# Altium schematic symbol library jlcpcb_2025_04_resistors_extended_0201.schlib: 1508 symbols (part 4 of 8) (continued)
## RC0201FR-0724K3L
designator R?  Resistance: 24.3kΩ  (hidden comment: *)
Resistor, 24.3kΩ, ±1%, 50mW, 25V, ±200ppm/℃, -55℃~+125℃, SMD 0201; Manufacturer: Uniroyal; Manufacturer Part Number: RC0201FR-0724K3L; Supplier 1: LCSC; Supplier Part Number 1: C474619; JLCPCB Part Number: C474619; Power Rating: 50mW; Category: Resistors; Package Size: 0201; JLCPCB Basic Part: Yes; Tolerance: ±1%; Voltage Rating: 25V; Temperature Coefficient: ±200ppm/℃; Temperature Rating: -55℃~+125℃; ComponentLink1Description: Datasheet; ComponentLink1URL: https://wmsc.lcsc.com/wmsc/upload/file/pdf/v2/lcsc/2311211101_YAGEO-RC0201FR-0724K3L_C474619.pdf; ComponentLink2Description: JLCPCB Part URL; ComponentLink2URL: https://jlcpcb.com/partdetail/C474619
pins: 1, 2
1 alternate drawing of the same symbol

## RC0201FR-0724K9L
designator R?  Resistance: 24.9kΩ  (hidden comment: *)
Resistor, 24.9kΩ, ±1%, 50mW, ±200ppm/℃, -55℃~+125℃, SMD 0201; Manufacturer: Uniroyal; Manufacturer Part Number: RC0201FR-0724K9L; Supplier 1: LCSC; Supplier Part Number 1: C474621; JLCPCB Part Number: C474621; Power Rating: 50mW; Category: Resistors; Package Size: 0201; JLCPCB Basic Part: Yes; Tolerance: ±1%; Temperature Coefficient: ±200ppm/℃; Temperature Rating: -55℃~+125℃; ComponentLink1Description: Datasheet; ComponentLink1URL: https://wmsc.lcsc.com/wmsc/upload/file/pdf/v2/lcsc/2311211101_YAGEO-RC0201FR-0724K9L_C474621.pdf; ComponentLink2Description: JLCPCB Part URL; ComponentLink2URL: https://jlcpcb.com/partdetail/C474621
pins: 1, 2
1 alternate drawing of the same symbol

## RC0201FR-0724KL
designator R?  Resistance: 24kΩ  (hidden comment: *)
Resistor, 24kΩ, ±1%, 50mW, 25V, ±200ppm/℃, -55℃~+125℃, SMD 0201; Manufacturer: Uniroyal; Manufacturer Part Number: RC0201FR-0724KL; Supplier 1: LCSC; Supplier Part Number 1: C273277; JLCPCB Part Number: C273277; Power Rating: 50mW; Category: Resistors; Package Size: 0201; JLCPCB Basic Part: Yes; Tolerance: ±1%; Voltage Rating: 25V; Temperature Coefficient: ±200ppm/℃; Temperature Rating: -55℃~+125℃; ComponentLink1Description: Datasheet; ComponentLink1URL: https://wmsc.lcsc.com/wmsc/upload/file/pdf/v2/lcsc/2304140030_YAGEO-RC0201FR-0724KL_C273277.pdf; ComponentLink2Description: JLCPCB Part URL; ComponentLink2URL: https://jlcpcb.com/partdetail/C273277
pins: 1, 2
1 alternate drawing of the same symbol

## RC0201FR-0724R9L
designator R?  Resistance: 24.9Ω  (hidden comment: *)
Resistor, 24.9Ω, ±1%, 50mW, 15V, ±200ppm/℃, -55℃~+125℃, SMD 0201; Manufacturer: Uniroyal; Manufacturer Part Number: RC0201FR-0724R9L; Supplier 1: LCSC; Supplier Part Number 1: C273274; JLCPCB Part Number: C273274; Power Rating: 50mW; Category: Resistors; Package Size: 0201; JLCPCB Basic Part: Yes; Tolerance: ±1%; Voltage Rating: 15V; Temperature Coefficient: ±200ppm/℃; Temperature Rating: -55℃~+125℃; ComponentLink1Description: Datasheet; ComponentLink1URL: https://wmsc.lcsc.com/wmsc/upload/file/pdf/v2/lcsc/2112151830_YAGEO-RC0201FR-0724R9L_C273274.pdf; ComponentLink2Description: JLCPCB Part URL; ComponentLink2URL: https://jlcpcb.com/partdetail/C273274
pins: 1, 2
1 alternate drawing of the same symbol

## RC0201FR-0726K7L
designator R?  Resistance: 26.7kΩ  (hidden comment: *)
Resistor, 26.7kΩ, ±1%, 50mW, ±200ppm/℃, -55℃~+125℃, SMD 0201; Manufacturer: Uniroyal; Manufacturer Part Number: RC0201FR-0726K7L; Supplier 1: LCSC; Supplier Part Number 1: C474627; JLCPCB Part Number: C474627; Power Rating: 50mW; Category: Resistors; Package Size: 0201; JLCPCB Basic Part: Yes; Tolerance: ±1%; Temperature Coefficient: ±200ppm/℃; Temperature Rating: -55℃~+125℃; ComponentLink1Description: Datasheet; ComponentLink1URL: https://wmsc.lcsc.com/wmsc/upload/file/pdf/v2/lcsc/2311211101_YAGEO-RC0201FR-0726K7L_C474627.pdf; ComponentLink2Description: JLCPCB Part URL; ComponentLink2URL: https://jlcpcb.com/partdetail/C474627
pins: 1, 2
1 alternate drawing of the same symbol

## RC0201FR-0727K4L
designator R?  Resistance: 27.4kΩ  (hidden comment: *)
Resistor, 27.4kΩ, ±1%, 50mW, 25V, ±200ppm/℃, -55℃~+125℃, SMD 0201; Manufacturer: Uniroyal; Manufacturer Part Number: RC0201FR-0727K4L; Supplier 1: LCSC; Supplier Part Number 1: C273316; JLCPCB Part Number: C273316; Power Rating: 50mW; Category: Resistors; Package Size: 0201; JLCPCB Basic Part: Yes; Tolerance: ±1%; Voltage Rating: 25V; Temperature Coefficient: ±200ppm/℃; Temperature Rating: -55℃~+125℃; ComponentLink1Description: Datasheet; ComponentLink1URL: https://wmsc.lcsc.com/wmsc/upload/file/pdf/v2/lcsc/2304140030_YAGEO-RC0201FR-0727K4L_C273316.pdf; ComponentLink2Description: JLCPCB Part URL; ComponentLink2URL: https://jlcpcb.com/partdetail/C273316
pins: 1, 2
1 alternate drawing of the same symbol

## RC0201FR-0727KL
designator R?  Resistance: 27kΩ  (hidden comment: *)
Resistor, 27kΩ, ±1%, 50mW, 25V, ±200ppm/℃, -55℃~+125℃, SMD 0201; Manufacturer: Uniroyal; Manufacturer Part Number: RC0201FR-0727KL; Supplier 1: LCSC; Supplier Part Number 1: C273283; JLCPCB Part Number: C273283; Power Rating: 50mW; Category: Resistors; Package Size: 0201; JLCPCB Basic Part: Yes; Tolerance: ±1%; Voltage Rating: 25V; Temperature Coefficient: ±200ppm/℃; Temperature Rating: -55℃~+125℃; ComponentLink1Description: Datasheet; ComponentLink1URL: https://wmsc.lcsc.com/wmsc/upload/file/pdf/v2/lcsc/2304140030_YAGEO-RC0201FR-0727KL_C273283.pdf; ComponentLink2Description: JLCPCB Part URL; ComponentLink2URL: https://jlcpcb.com/partdetail/C273283
pins: 1, 2
1 alternate drawing of the same symbol

## RC0201FR-0727RL
designator R?  Resistance: 27Ω  (hidden comment: *)
Resistor, 27Ω, ±1%, 50mW, 25V, ±200ppm/℃, -55℃~+125℃, SMD 0201; Manufacturer: Uniroyal; Manufacturer Part Number: RC0201FR-0727RL; Supplier 1: LCSC; Supplier Part Number 1: C273268; JLCPCB Part Number: C273268; Power Rating: 50mW; Category: Resistors; Package Size: 0201; JLCPCB Basic Part: Yes; Tolerance: ±1%; Voltage Rating: 25V; Temperature Coefficient: ±200ppm/℃; Temperature Rating: -55℃~+125℃; ComponentLink1Description: Datasheet; ComponentLink1URL: https://wmsc.lcsc.com/wmsc/upload/file/pdf/v2/lcsc/2304140030_YAGEO-RC0201FR-0727RL_C273268.pdf; ComponentLink2Description: JLCPCB Part URL; ComponentLink2URL: https://jlcpcb.com/partdetail/C273268
pins: 1, 2
1 alternate drawing of the same symbol

## RC0201FR-0728KL
designator R?  Resistance: 28kΩ  (hidden comment: *)
Resistor, 28kΩ, ±1%, 50mW, 25V, ±200ppm/℃, -55℃~+125℃, SMD 0201; Manufacturer: Uniroyal; Manufacturer Part Number: RC0201FR-0728KL; Supplier 1: LCSC; Supplier Part Number 1: C273300; JLCPCB Part Number: C273300; Power Rating: 50mW; Category: Resistors; Package Size: 0201; JLCPCB Basic Part: Yes; Tolerance: ±1%; Voltage Rating: 25V; Temperature Coefficient: ±200ppm/℃; Temperature Rating: -55℃~+125℃; ComponentLink1Description: Datasheet; ComponentLink1URL: https://wmsc.lcsc.com/wmsc/upload/file/pdf/v2/lcsc/2201242230_YAGEO-RC0201FR-0728KL_C273300.pdf; ComponentLink2Description: JLCPCB Part URL; ComponentLink2URL: https://jlcpcb.com/partdetail/C273300
pins: 1, 2
1 alternate drawing of the same symbol

## RC0201FR-0729K4L
designator R?  Resistance: 29.4kΩ  (hidden comment: *)
Resistor, 29.4kΩ, ±1%, 50mW, 25V, ±200ppm/℃, -55℃~+125℃, SMD 0201; Manufacturer: Uniroyal; Manufacturer Part Number: RC0201FR-0729K4L; Supplier 1: LCSC; Supplier Part Number 1: C138157; JLCPCB Part Number: C138157; Power Rating: 50mW; Category: Resistors; Package Size: 0201; JLCPCB Basic Part: Yes; Tolerance: ±1%; Voltage Rating: 25V; Temperature Coefficient: ±200ppm/℃; Temperature Rating: -55℃~+125℃; ComponentLink1Description: Datasheet; ComponentLink1URL: https://wmsc.lcsc.com/wmsc/upload/file/pdf/v2/lcsc/2304140030_YAGEO-RC0201FR-0729K4L_C138157.pdf; ComponentLink2Description: JLCPCB Part URL; ComponentLink2URL: https://jlcpcb.com/partdetail/C138157
pins: 1, 2
1 alternate drawing of the same symbol

## RC0201FR-0730K1L
designator R?  Resistance: 30.1kΩ  (hidden comment: *)
Resistor, 30.1kΩ, ±1%, 50mW, 25V, ±200ppm/℃, -55℃~+125℃, SMD 0201; Manufacturer: Uniroyal; Manufacturer Part Number: RC0201FR-0730K1L; Supplier 1: LCSC; Supplier Part Number 1: C273278; JLCPCB Part Number: C273278; Power Rating: 50mW; Category: Resistors; Package Size: 0201; JLCPCB Basic Part: Yes; Tolerance: ±1%; Voltage Rating: 25V; Temperature Coefficient: ±200ppm/℃; Temperature Rating: -55℃~+125℃; ComponentLink1Description: Datasheet; ComponentLink1URL: https://wmsc.lcsc.com/wmsc/upload/file/pdf/v2/lcsc/2304140030_YAGEO-RC0201FR-0730K1L_C273278.pdf; ComponentLink2Description: JLCPCB Part URL; ComponentLink2URL: https://jlcpcb.com/partdetail/C273278
pins: 1, 2
1 alternate drawing of the same symbol

## RC0201FR-0730R1L
designator R?  Resistance: 30.1Ω  (hidden comment: *)
Resistor, 30.1Ω, ±1%, 50mW, 25V, ±200ppm/℃, -55℃~+125℃, SMD 0201; Manufacturer: Uniroyal; Manufacturer Part Number: RC0201FR-0730R1L; Supplier 1: LCSC; Supplier Part Number 1: C474673; JLCPCB Part Number: C474673; Power Rating: 50mW; Category: Resistors; Package Size: 0201; JLCPCB Basic Part: Yes; Tolerance: ±1%; Voltage Rating: 25V; Temperature Coefficient: ±200ppm/℃; Temperature Rating: -55℃~+125℃; ComponentLink1Description: Datasheet; ComponentLink1URL: https://wmsc.lcsc.com/wmsc/upload/file/pdf/v2/lcsc/2311211101_YAGEO-RC0201FR-0730R1L_C474673.pdf; ComponentLink2Description: JLCPCB Part URL; ComponentLink2URL: https://jlcpcb.com/partdetail/C474673
pins: 1, 2
1 alternate drawing of the same symbol

## RC0201FR-0732K4L
designator R?  Resistance: 32.4kΩ  (hidden comment: *)
Resistor, 32.4kΩ, ±1%, 50mW, 25V, ±200ppm/℃, -55℃~+125℃, SMD 0201; Manufacturer: Uniroyal; Manufacturer Part Number: RC0201FR-0732K4L; Supplier 1: LCSC; Supplier Part Number 1: C138150; JLCPCB Part Number: C138150; Power Rating: 50mW; Category: Resistors; Package Size: 0201; JLCPCB Basic Part: Yes; Tolerance: ±1%; Voltage Rating: 25V; Temperature Coefficient: ±200ppm/℃; Temperature Rating: -55℃~+125℃; ComponentLink1Description: Datasheet; ComponentLink1URL: https://wmsc.lcsc.com/wmsc/upload/file/pdf/v2/lcsc/2304140030_YAGEO-RC0201FR-0732K4L_C138150.pdf; ComponentLink2Description: JLCPCB Part URL; ComponentLink2URL: https://jlcpcb.com/partdetail/C138150
pins: 1, 2
1 alternate drawing of the same symbol

## RC0201FR-0733K2L
designator R?  Resistance: 33.2kΩ  (hidden comment: *)
Resistor, 33.2kΩ, ±1%, 50mW, 25V, ±200ppm/℃, -55℃~+125℃, SMD 0201; Manufacturer: Uniroyal; Manufacturer Part Number: RC0201FR-0733K2L; Supplier 1: LCSC; Supplier Part Number 1: C474684; JLCPCB Part Number: C474684; Power Rating: 50mW; Category: Resistors; Package Size: 0201; JLCPCB Basic Part: Yes; Tolerance: ±1%; Voltage Rating: 25V; Temperature Coefficient: ±200ppm/℃; Temperature Rating: -55℃~+125℃; ComponentLink1Description: Datasheet; ComponentLink1URL: https://wmsc.lcsc.com/wmsc/upload/file/pdf/v2/lcsc/2311211101_YAGEO-RC0201FR-0733K2L_C474684.pdf; ComponentLink2Description: JLCPCB Part URL; ComponentLink2URL: https://jlcpcb.com/partdetail/C474684
pins: 1, 2
1 alternate drawing of the same symbol

## RC0201FR-0733KL
designator R?  Resistance: 33kΩ  (hidden comment: *)
Resistor, 33kΩ, ±1%, 50mW, 25V, ±200ppm/℃, -55℃~+125℃, SMD 0201; Manufacturer: Uniroyal; Manufacturer Part Number: RC0201FR-0733KL; Supplier 1: LCSC; Supplier Part Number 1: C155694; JLCPCB Part Number: C155694; Power Rating: 50mW; Category: Resistors; Package Size: 0201; JLCPCB Basic Part: Yes; Tolerance: ±1%; Voltage Rating: 25V; Temperature Coefficient: ±200ppm/℃; Temperature Rating: -55℃~+125℃; ComponentLink1Description: Datasheet; ComponentLink1URL: https://wmsc.lcsc.com/wmsc/upload/file/pdf/v2/lcsc/2304140030_YAGEO-RC0201FR-0733KL_C155694.pdf; ComponentLink2Description: JLCPCB Part URL; ComponentLink2URL: https://jlcpcb.com/partdetail/C155694
pins: 1, 2
1 alternate drawing of the same symbol

## RC0201FR-0733R2L
designator R?  Resistance: 33.2Ω  (hidden comment: *)
Resistor, 33.2Ω, ±1%, 50mW, ±200ppm/℃, -55℃~+125℃, SMD 0201; Manufacturer: Uniroyal; Manufacturer Part Number: RC0201FR-0733R2L; Supplier 1: LCSC; Supplier Part Number 1: C474685; JLCPCB Part Number: C474685; Power Rating: 50mW; Category: Resistors; Package Size: 0201; JLCPCB Basic Part: Yes; Tolerance: ±1%; Temperature Coefficient: ±200ppm/℃; Temperature Rating: -55℃~+125℃; ComponentLink1Description: Datasheet; ComponentLink1URL: https://wmsc.lcsc.com/wmsc/upload/file/pdf/v2/lcsc/2311211101_YAGEO-RC0201FR-0733R2L_C474685.pdf; ComponentLink2Description: JLCPCB Part URL; ComponentLink2URL: https://jlcpcb.com/partdetail/C474685
pins: 1, 2
1 alternate drawing of the same symbol

## RC0201FR-0733RL
designator R?  Resistance: 33Ω  (hidden comment: *)
Resistor, 33Ω, ±1%, 50mW, 25V, ±200ppm/℃, -55℃~+125℃, SMD 0201; Manufacturer: Uniroyal; Manufacturer Part Number: RC0201FR-0733RL; Supplier 1: LCSC; Supplier Part Number 1: C295794; JLCPCB Part Number: C295794; Power Rating: 50mW; Category: Resistors; Package Size: 0201; JLCPCB Basic Part: Yes; Tolerance: ±1%; Voltage Rating: 25V; Temperature Coefficient: ±200ppm/℃; Temperature Rating: -55℃~+125℃; ComponentLink1Description: Datasheet; ComponentLink1URL: https://wmsc.lcsc.com/wmsc/upload/file/pdf/v2/lcsc/2304140030_YAGEO-RC0201FR-0733RL_C295794.pdf; ComponentLink2Description: JLCPCB Part URL; ComponentLink2URL: https://jlcpcb.com/partdetail/C295794
pins: 1, 2
1 alternate drawing of the same symbol

## RC0201FR-0734KL
designator R?  Resistance: 34kΩ  (hidden comment: *)
Resistor, 34kΩ, ±1%, 50mW, 25V, ±200ppm/℃, -55℃~+125℃, SMD 0201; Manufacturer: Uniroyal; Manufacturer Part Number: RC0201FR-0734KL; Supplier 1: LCSC; Supplier Part Number 1: C273307; JLCPCB Part Number: C273307; Power Rating: 50mW; Category: Resistors; Package Size: 0201; JLCPCB Basic Part: Yes; Tolerance: ±1%; Voltage Rating: 25V; Temperature Coefficient: ±200ppm/℃; Temperature Rating: -55℃~+125℃; ComponentLink1Description: Datasheet; ComponentLink1URL: https://wmsc.lcsc.com/wmsc/upload/file/pdf/v2/lcsc/2304140030_YAGEO-RC0201FR-0734KL_C273307.pdf; ComponentLink2Description: JLCPCB Part URL; ComponentLink2URL: https://jlcpcb.com/partdetail/C273307
pins: 1, 2
1 alternate drawing of the same symbol

## RC0201FR-0734R8L
designator R?  Resistance: 34.8Ω  (hidden comment: *)
Resistor, 34.8Ω, ±1%, 50mW, 25V, ±200ppm/℃, -55℃~+125℃, SMD 0201; Manufacturer: Uniroyal; Manufacturer Part Number: RC0201FR-0734R8L; Supplier 1: LCSC; Supplier Part Number 1: C273311; JLCPCB Part Number: C273311; Power Rating: 50mW; Category: Resistors; Package Size: 0201; JLCPCB Basic Part: Yes; Tolerance: ±1%; Voltage Rating: 25V; Temperature Coefficient: ±200ppm/℃; Temperature Rating: -55℃~+125℃; ComponentLink1Description: Datasheet; ComponentLink1URL: https://wmsc.lcsc.com/wmsc/upload/file/pdf/v2/lcsc/2304140030_YAGEO-RC0201FR-0734R8L_C273311.pdf; ComponentLink2Description: JLCPCB Part URL; ComponentLink2URL: https://jlcpcb.com/partdetail/C273311
pins: 1, 2
1 alternate drawing of the same symbol

## RC0201FR-0734RL
designator R?  Resistance: 34Ω  (hidden comment: *)
Resistor, 34Ω, ±1%, 50mW, 25V, ±200ppm/℃, -55℃~+125℃, SMD 0201; Manufacturer: Uniroyal; Manufacturer Part Number: RC0201FR-0734RL; Supplier 1: LCSC; Supplier Part Number 1: C138149; JLCPCB Part Number: C138149; Power Rating: 50mW; Category: Resistors; Package Size: 0201; JLCPCB Basic Part: Yes; Tolerance: ±1%; Voltage Rating: 25V; Temperature Coefficient: ±200ppm/℃; Temperature Rating: -55℃~+125℃; ComponentLink1Description: Datasheet; ComponentLink1URL: https://wmsc.lcsc.com/wmsc/upload/file/pdf/v2/lcsc/2304140030_YAGEO-RC0201FR-0734RL_C138149.pdf; ComponentLink2Description: JLCPCB Part URL; ComponentLink2URL: https://jlcpcb.com/partdetail/C138149
pins: 1, 2
1 alternate drawing of the same symbol

## RC0201FR-0735K7L
designator R?  Resistance: 35.7kΩ  (hidden comment: *)
Resistor, 35.7kΩ, ±1%, 50mW, ±200ppm/℃, -55℃~+125℃, SMD 0201; Manufacturer: Uniroyal; Manufacturer Part Number: RC0201FR-0735K7L; Supplier 1: LCSC; Supplier Part Number 1: C474690; JLCPCB Part Number: C474690; Power Rating: 50mW; Category: Resistors; Package Size: 0201; JLCPCB Basic Part: Yes; Tolerance: ±1%; Temperature Coefficient: ±200ppm/℃; Temperature Rating: -55℃~+125℃; ComponentLink1Description: Datasheet; ComponentLink1URL: https://wmsc.lcsc.com/wmsc/upload/file/pdf/v2/lcsc/2311211101_YAGEO-RC0201FR-0735K7L_C474690.pdf; ComponentLink2Description: JLCPCB Part URL; ComponentLink2URL: https://jlcpcb.com/partdetail/C474690
pins: 1, 2
1 alternate drawing of the same symbol

## RC0201FR-0736K5L
designator R?  Resistance: 36.5kΩ  (hidden comment: *)
Resistor, 36.5kΩ, ±1%, 50mW, ±200ppm/℃, -55℃~+125℃, SMD 0201; Manufacturer: Uniroyal; Manufacturer Part Number: RC0201FR-0736K5L; Supplier 1: LCSC; Supplier Part Number 1: C474692; JLCPCB Part Number: C474692; Power Rating: 50mW; Category: Resistors; Package Size: 0201; JLCPCB Basic Part: Yes; Tolerance: ±1%; Temperature Coefficient: ±200ppm/℃; Temperature Rating: -55℃~+125℃; ComponentLink1Description: Datasheet; ComponentLink1URL: https://wmsc.lcsc.com/wmsc/upload/file/pdf/v2/lcsc/2311211101_YAGEO-RC0201FR-0736K5L_C474692.pdf; ComponentLink2Description: JLCPCB Part URL; ComponentLink2URL: https://jlcpcb.com/partdetail/C474692
pins: 1, 2
1 alternate drawing of the same symbol

## RC0201FR-0736KL
designator R?  Resistance: 36kΩ  (hidden comment: *)
Resistor, 36kΩ, ±1%, 50mW, 25V, ±200ppm/℃, -55℃~+125℃, SMD 0201; Manufacturer: Uniroyal; Manufacturer Part Number: RC0201FR-0736KL; Supplier 1: LCSC; Supplier Part Number 1: C295796; JLCPCB Part Number: C295796; Power Rating: 50mW; Category: Resistors; Package Size: 0201; JLCPCB Basic Part: Yes; Tolerance: ±1%; Voltage Rating: 25V; Temperature Coefficient: ±200ppm/℃; Temperature Rating: -55℃~+125℃; ComponentLink1Description: Datasheet; ComponentLink1URL: https://wmsc.lcsc.com/wmsc/upload/file/pdf/v2/lcsc/2304140030_YAGEO-RC0201FR-0736KL_C295796.pdf; ComponentLink2Description: JLCPCB Part URL; ComponentLink2URL: https://jlcpcb.com/partdetail/C295796
pins: 1, 2
1 alternate drawing of the same symbol

## RC0201FR-0738K3L
designator R?  Resistance: 38.3kΩ  (hidden comment: *)
Resistor, 38.3kΩ, ±1%, 50mW, 25V, ±200ppm/℃, -55℃~+125℃, SMD 0201; Manufacturer: Uniroyal; Manufacturer Part Number: RC0201FR-0738K3L; Supplier 1: LCSC; Supplier Part Number 1: C474696; JLCPCB Part Number: C474696; Power Rating: 50mW; Category: Resistors; Package Size: 0201; JLCPCB Basic Part: Yes; Tolerance: ±1%; Voltage Rating: 25V; Temperature Coefficient: ±200ppm/℃; Temperature Rating: -55℃~+125℃; ComponentLink1Description: Datasheet; ComponentLink1URL: https://wmsc.lcsc.com/wmsc/upload/file/pdf/v2/lcsc/2311211101_YAGEO-RC0201FR-0738K3L_C474696.pdf; ComponentLink2Description: JLCPCB Part URL; ComponentLink2URL: https://jlcpcb.com/partdetail/C474696
pins: 1, 2
1 alternate drawing of the same symbol

## RC0201FR-0739K2L
designator R?  Resistance: 39.2kΩ  (hidden comment: *)
Resistor, 39.2kΩ, ±1%, 50mW, ±200ppm/℃, -55℃~+125℃, SMD 0201; Manufacturer: Uniroyal; Manufacturer Part Number: RC0201FR-0739K2L; Supplier 1: LCSC; Supplier Part Number 1: C474699; JLCPCB Part Number: C474699; Power Rating: 50mW; Category: Resistors; Package Size: 0201; JLCPCB Basic Part: Yes; Tolerance: ±1%; Temperature Coefficient: ±200ppm/℃; Temperature Rating: -55℃~+125℃; ComponentLink1Description: Datasheet; ComponentLink1URL: https://wmsc.lcsc.com/wmsc/upload/file/pdf/v2/lcsc/2311211101_YAGEO-RC0201FR-0739K2L_C474699.pdf; ComponentLink2Description: JLCPCB Part URL; ComponentLink2URL: https://jlcpcb.com/partdetail/C474699
pins: 1, 2
1 alternate drawing of the same symbol

## RC0201FR-0739KL
designator R?  Resistance: 39kΩ  (hidden comment: *)
Resistor, 39kΩ, ±1%, 50mW, 25V, ±200ppm/℃, -55℃~+125℃, SMD 0201; Manufacturer: Uniroyal; Manufacturer Part Number: RC0201FR-0739KL; Supplier 1: LCSC; Supplier Part Number 1: C163500; JLCPCB Part Number: C163500; Power Rating: 50mW; Category: Resistors; Package Size: 0201; JLCPCB Basic Part: Yes; Tolerance: ±1%; Voltage Rating: 25V; Temperature Coefficient: ±200ppm/℃; Temperature Rating: -55℃~+125℃; ComponentLink1Description: Datasheet; ComponentLink1URL: https://wmsc.lcsc.com/wmsc/upload/file/pdf/v2/lcsc/2304140030_YAGEO-RC0201FR-0739KL_C163500.pdf; ComponentLink2Description: JLCPCB Part URL; ComponentLink2URL: https://jlcpcb.com/partdetail/C163500
pins: 1, 2
1 alternate drawing of the same symbol

## RC0201FR-0739RL
designator R?  Resistance: 39Ω  (hidden comment: *)
Resistor, 39Ω, ±1%, 50mW, 25V, ±200ppm/℃, -55℃~+125℃, SMD 0201; Manufacturer: Uniroyal; Manufacturer Part Number: RC0201FR-0739RL; Supplier 1: LCSC; Supplier Part Number 1: C138145; JLCPCB Part Number: C138145; Power Rating: 50mW; Category: Resistors; Package Size: 0201; JLCPCB Basic Part: Yes; Tolerance: ±1%; Voltage Rating: 25V; Temperature Coefficient: ±200ppm/℃; Temperature Rating: -55℃~+125℃; ComponentLink1Description: Datasheet; ComponentLink1URL: https://wmsc.lcsc.com/wmsc/upload/file/pdf/v2/lcsc/2304140030_YAGEO-RC0201FR-0739RL_C138145.pdf; ComponentLink2Description: JLCPCB Part URL; ComponentLink2URL: https://jlcpcb.com/partdetail/C138145
pins: 1, 2
1 alternate drawing of the same symbol

## RC0201FR-0740K2L
designator R?  Resistance: 40.2kΩ  (hidden comment: *)
Resistor, 40.2kΩ, ±1%, 50mW, 25V, ±200ppm/℃, -55℃~+125℃, SMD 0201; Manufacturer: Uniroyal; Manufacturer Part Number: RC0201FR-0740K2L; Supplier 1: LCSC; Supplier Part Number 1: C274875; JLCPCB Part Number: C274875; Power Rating: 50mW; Category: Resistors; Package Size: 0201; JLCPCB Basic Part: Yes; Tolerance: ±1%; Voltage Rating: 25V; Temperature Coefficient: ±200ppm/℃; Temperature Rating: -55℃~+125℃; ComponentLink1Description: Datasheet; ComponentLink1URL: https://wmsc.lcsc.com/wmsc/upload/file/pdf/v2/lcsc/2304140030_YAGEO-RC0201FR-0740K2L_C274875.pdf; ComponentLink2Description: JLCPCB Part URL; ComponentLink2URL: https://jlcpcb.com/partdetail/C274875
pins: 1, 2
1 alternate drawing of the same symbol

## RC0201FR-0741K2L
designator R?  Resistance: 41.2kΩ  (hidden comment: *)
Resistor, 41.2kΩ, ±1%, 50mW, 25V, ±200ppm/℃, -55℃~+125℃, SMD 0201; Manufacturer: Uniroyal; Manufacturer Part Number: RC0201FR-0741K2L; Supplier 1: LCSC; Supplier Part Number 1: C327387; JLCPCB Part Number: C327387; Power Rating: 50mW; Category: Resistors; Package Size: 0201; JLCPCB Basic Part: Yes; Tolerance: ±1%; Voltage Rating: 25V; Temperature Coefficient: ±200ppm/℃; Temperature Rating: -55℃~+125℃; ComponentLink1Description: Datasheet; ComponentLink1URL: https://wmsc.lcsc.com/wmsc/upload/file/pdf/v2/lcsc/1811141154_YAGEO-RC0201FR-0741K2L_C327387.pdf; ComponentLink2Description: JLCPCB Part URL; ComponentLink2URL: https://jlcpcb.com/partdetail/C327387
pins: 1, 2
1 alternate drawing of the same symbol

## RC0201FR-0742K2L
designator R?  Resistance: 42.2kΩ  (hidden comment: *)
Resistor, 42.2kΩ, ±1%, 50mW, ±200ppm/℃, -55℃~+125℃, SMD 0201; Manufacturer: Uniroyal; Manufacturer Part Number: RC0201FR-0742K2L; Supplier 1: LCSC; Supplier Part Number 1: C474723; JLCPCB Part Number: C474723; Power Rating: 50mW; Category: Resistors; Package Size: 0201; JLCPCB Basic Part: Yes; Tolerance: ±1%; Temperature Coefficient: ±200ppm/℃; Temperature Rating: -55℃~+125℃; ComponentLink1Description: Datasheet; ComponentLink1URL: https://wmsc.lcsc.com/wmsc/upload/file/pdf/v2/lcsc/2311211101_YAGEO-RC0201FR-0742K2L_C474723.pdf; ComponentLink2Description: JLCPCB Part URL; ComponentLink2URL: https://jlcpcb.com/partdetail/C474723
pins: 1, 2
1 alternate drawing of the same symbol

## RC0201FR-0743K2L
designator R?  Resistance: 43.2kΩ  (hidden comment: *)
Resistor, 43.2kΩ, ±1%, 50mW, 25V, ±200ppm/℃, -55℃~+125℃, SMD 0201; Manufacturer: Uniroyal; Manufacturer Part Number: RC0201FR-0743K2L; Supplier 1: LCSC; Supplier Part Number 1: C138143; JLCPCB Part Number: C138143; Power Rating: 50mW; Category: Resistors; Package Size: 0201; JLCPCB Basic Part: Yes; Tolerance: ±1%; Voltage Rating: 25V; Temperature Coefficient: ±200ppm/℃; Temperature Rating: -55℃~+125℃; ComponentLink1Description: Datasheet; ComponentLink1URL: https://wmsc.lcsc.com/wmsc/upload/file/pdf/v2/lcsc/2304140030_YAGEO-RC0201FR-0743K2L_C138143.pdf; ComponentLink2Description: JLCPCB Part URL; ComponentLink2URL: https://jlcpcb.com/partdetail/C138143
pins: 1, 2
1 alternate drawing of the same symbol

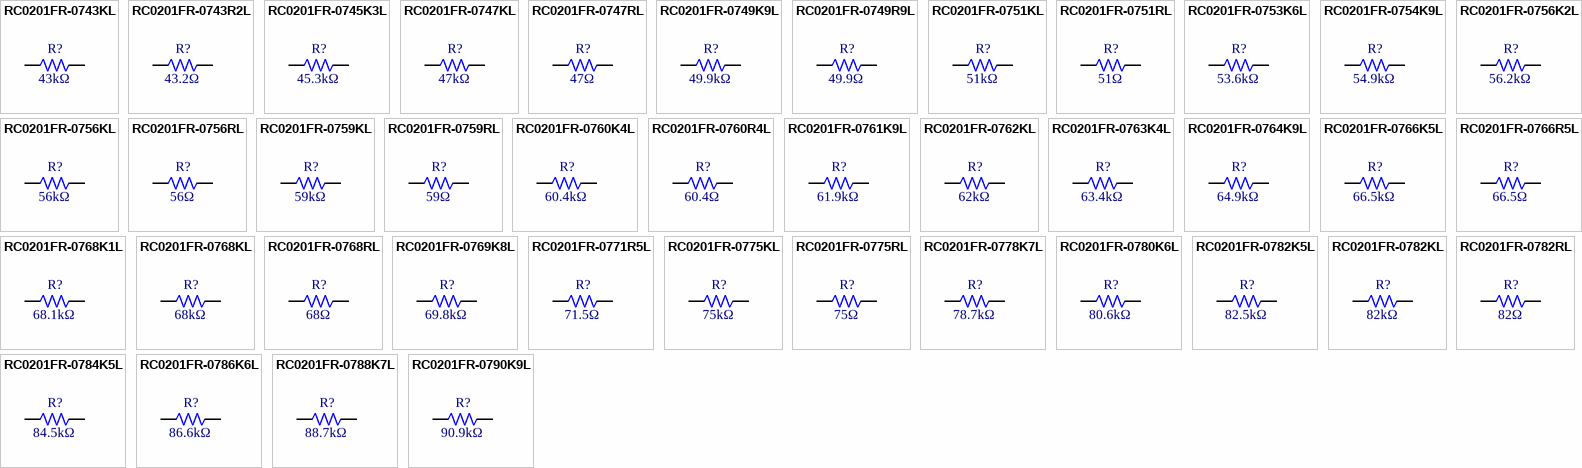
[diagram p19: symbols RC0201FR-0743KL to RC0201FR-0790K9L]

## RC0201FR-0743KL
designator R?  Resistance: 43kΩ  (hidden comment: *)
Resistor, 43kΩ, ±1%, 50mW, 25V, ±200ppm/℃, -55℃~+125℃, SMD 0201; Manufacturer: Uniroyal; Manufacturer Part Number: RC0201FR-0743KL; Supplier 1: LCSC; Supplier Part Number 1: C138142; JLCPCB Part Number: C138142; Power Rating: 50mW; Category: Resistors; Package Size: 0201; JLCPCB Basic Part: Yes; Tolerance: ±1%; Voltage Rating: 25V; Temperature Coefficient: ±200ppm/℃; Temperature Rating: -55℃~+125℃; ComponentLink1Description: Datasheet; ComponentLink1URL: https://wmsc.lcsc.com/wmsc/upload/file/pdf/v2/lcsc/2304140030_YAGEO-RC0201FR-0743KL_C138142.pdf; ComponentLink2Description: JLCPCB Part URL; ComponentLink2URL: https://jlcpcb.com/partdetail/C138142
pins: 1, 2
1 alternate drawing of the same symbol

## RC0201FR-0743R2L
designator R?  Resistance: 43.2Ω  (hidden comment: *)
Resistor, 43.2Ω, ±1%, 50mW, ±200ppm/℃, -55℃~+125℃, SMD 0201; Manufacturer: Uniroyal; Manufacturer Part Number: RC0201FR-0743R2L; Supplier 1: LCSC; Supplier Part Number 1: C854574; JLCPCB Part Number: C854574; Power Rating: 50mW; Category: Resistors; Package Size: 0201; JLCPCB Basic Part: Yes; Tolerance: ±1%; Temperature Coefficient: ±200ppm/℃; Temperature Rating: -55℃~+125℃; ComponentLink1Description: Datasheet; ComponentLink1URL: https://wmsc.lcsc.com/wmsc/upload/file/pdf/v2/lcsc/2210190300_YAGEO-RC0201FR-0743R2L_C854574.pdf; ComponentLink2Description: JLCPCB Part URL; ComponentLink2URL: https://jlcpcb.com/partdetail/C854574
pins: 1, 2
1 alternate drawing of the same symbol

## RC0201FR-0745K3L
designator R?  Resistance: 45.3kΩ  (hidden comment: *)
Resistor, 45.3kΩ, ±1%, 50mW, 25V, ±200ppm/℃, -55℃~+125℃, SMD 0201; Manufacturer: Uniroyal; Manufacturer Part Number: RC0201FR-0745K3L; Supplier 1: LCSC; Supplier Part Number 1: C364365; JLCPCB Part Number: C364365; Power Rating: 50mW; Category: Resistors; Package Size: 0201; JLCPCB Basic Part: Yes; Tolerance: ±1%; Voltage Rating: 25V; Temperature Coefficient: ±200ppm/℃; Temperature Rating: -55℃~+125℃; ComponentLink1Description: Datasheet; ComponentLink1URL: https://wmsc.lcsc.com/wmsc/upload/file/pdf/v2/lcsc/1912111437_YAGEO-RC0201FR-0745K3L_C364365.pdf; ComponentLink2Description: JLCPCB Part URL; ComponentLink2URL: https://jlcpcb.com/partdetail/C364365
pins: 1, 2
1 alternate drawing of the same symbol

## RC0201FR-0747KL
designator R?  Resistance: 47kΩ  (hidden comment: *)
Resistor, 47kΩ, ±1%, 50mW, 25V, ±200ppm/℃, -55℃~+125℃, SMD 0201; Manufacturer: Uniroyal; Manufacturer Part Number: RC0201FR-0747KL; Supplier 1: LCSC; Supplier Part Number 1: C138139; JLCPCB Part Number: C138139; Power Rating: 50mW; Category: Resistors; Package Size: 0201; JLCPCB Basic Part: Yes; Tolerance: ±1%; Voltage Rating: 25V; Temperature Coefficient: ±200ppm/℃; Temperature Rating: -55℃~+125℃; ComponentLink1Description: Datasheet; ComponentLink1URL: https://wmsc.lcsc.com/wmsc/upload/file/pdf/v2/lcsc/2304140030_YAGEO-RC0201FR-0747KL_C138139.pdf; ComponentLink2Description: JLCPCB Part URL; ComponentLink2URL: https://jlcpcb.com/partdetail/C138139
pins: 1, 2
1 alternate drawing of the same symbol

## RC0201FR-0747RL
designator R?  Resistance: 47Ω  (hidden comment: *)
Resistor, 47Ω, ±1%, 50mW, 25V, ±200ppm/℃, -55℃~+125℃, SMD 0201; Manufacturer: Uniroyal; Manufacturer Part Number: RC0201FR-0747RL; Supplier 1: LCSC; Supplier Part Number 1: C273279; JLCPCB Part Number: C273279; Power Rating: 50mW; Category: Resistors; Package Size: 0201; JLCPCB Basic Part: Yes; Tolerance: ±1%; Voltage Rating: 25V; Temperature Coefficient: ±200ppm/℃; Temperature Rating: -55℃~+125℃; ComponentLink1Description: Datasheet; ComponentLink1URL: https://wmsc.lcsc.com/wmsc/upload/file/pdf/v2/lcsc/2304140030_YAGEO-RC0201FR-0747RL_C273279.pdf; ComponentLink2Description: JLCPCB Part URL; ComponentLink2URL: https://jlcpcb.com/partdetail/C273279
pins: 1, 2
1 alternate drawing of the same symbol

## RC0201FR-0749K9L
designator R?  Resistance: 49.9kΩ  (hidden comment: *)
Resistor, 49.9kΩ, ±1%, 50mW, 25V, ±200ppm/℃, -55℃~+125℃, SMD 0201; Manufacturer: Uniroyal; Manufacturer Part Number: RC0201FR-0749K9L; Supplier 1: LCSC; Supplier Part Number 1: C138136; JLCPCB Part Number: C138136; Power Rating: 50mW; Category: Resistors; Package Size: 0201; JLCPCB Basic Part: Yes; Tolerance: ±1%; Voltage Rating: 25V; Temperature Coefficient: ±200ppm/℃; Temperature Rating: -55℃~+125℃; ComponentLink1Description: Datasheet; ComponentLink1URL: https://wmsc.lcsc.com/wmsc/upload/file/pdf/v2/lcsc/2304140030_YAGEO-RC0201FR-0749K9L_C138136.pdf; ComponentLink2Description: JLCPCB Part URL; ComponentLink2URL: https://jlcpcb.com/partdetail/C138136
pins: 1, 2
1 alternate drawing of the same symbol

## RC0201FR-0749R9L
designator R?  Resistance: 49.9Ω  (hidden comment: *)
Resistor, 49.9Ω, ±1%, 50mW, 25V, ±200ppm/℃, -55℃~+125℃, SMD 0201; Manufacturer: Uniroyal; Manufacturer Part Number: RC0201FR-0749R9L; Supplier 1: LCSC; Supplier Part Number 1: C155744; JLCPCB Part Number: C155744; Power Rating: 50mW; Category: Resistors; Package Size: 0201; JLCPCB Basic Part: Yes; Tolerance: ±1%; Voltage Rating: 25V; Temperature Coefficient: ±200ppm/℃; Temperature Rating: -55℃~+125℃; ComponentLink1Description: Datasheet; ComponentLink1URL: https://wmsc.lcsc.com/wmsc/upload/file/pdf/v2/lcsc/2304140030_YAGEO-RC0201FR-0749R9L_C155744.pdf; ComponentLink2Description: JLCPCB Part URL; ComponentLink2URL: https://jlcpcb.com/partdetail/C155744
pins: 1, 2
1 alternate drawing of the same symbol

## RC0201FR-0751KL
designator R?  Resistance: 51kΩ  (hidden comment: *)
Resistor, 51kΩ, ±1%, 50mW, 25V, ±200ppm/℃, -55℃~+125℃, SMD 0201; Manufacturer: Uniroyal; Manufacturer Part Number: RC0201FR-0751KL; Supplier 1: LCSC; Supplier Part Number 1: C295806; JLCPCB Part Number: C295806; Power Rating: 50mW; Category: Resistors; Package Size: 0201; JLCPCB Basic Part: Yes; Tolerance: ±1%; Voltage Rating: 25V; Temperature Coefficient: ±200ppm/℃; Temperature Rating: -55℃~+125℃; ComponentLink1Description: Datasheet; ComponentLink1URL: https://wmsc.lcsc.com/wmsc/upload/file/pdf/v2/lcsc/2304140030_YAGEO-RC0201FR-0751KL_C295806.pdf; ComponentLink2Description: JLCPCB Part URL; ComponentLink2URL: https://jlcpcb.com/partdetail/C295806
pins: 1, 2
1 alternate drawing of the same symbol

## RC0201FR-0751RL
designator R?  Resistance: 51Ω  (hidden comment: *)
Resistor, 51Ω, ±1%, 50mW, 25V, ±200ppm/℃, -55℃~+125℃, SMD 0201; Manufacturer: Uniroyal; Manufacturer Part Number: RC0201FR-0751RL; Supplier 1: LCSC; Supplier Part Number 1: C163499; JLCPCB Part Number: C163499; Power Rating: 50mW; Category: Resistors; Package Size: 0201; JLCPCB Basic Part: Yes; Tolerance: ±1%; Voltage Rating: 25V; Temperature Coefficient: ±200ppm/℃; Temperature Rating: -55℃~+125℃; ComponentLink1Description: Datasheet; ComponentLink1URL: https://wmsc.lcsc.com/wmsc/upload/file/pdf/v2/lcsc/2304140030_YAGEO-RC0201FR-0751RL_C163499.pdf; ComponentLink2Description: JLCPCB Part URL; ComponentLink2URL: https://jlcpcb.com/partdetail/C163499
pins: 1, 2
1 alternate drawing of the same symbol

## RC0201FR-0753K6L
designator R?  Resistance: 53.6kΩ  (hidden comment: *)
Resistor, 53.6kΩ, ±1%, 50mW, 25V, ±200ppm/℃, -55℃~+125℃, SMD 0201; Manufacturer: Uniroyal; Manufacturer Part Number: RC0201FR-0753K6L; Supplier 1: LCSC; Supplier Part Number 1: C474764; JLCPCB Part Number: C474764; Power Rating: 50mW; Category: Resistors; Package Size: 0201; JLCPCB Basic Part: Yes; Tolerance: ±1%; Voltage Rating: 25V; Temperature Coefficient: ±200ppm/℃; Temperature Rating: -55℃~+125℃; ComponentLink1Description: Datasheet; ComponentLink1URL: https://wmsc.lcsc.com/wmsc/upload/file/pdf/v2/lcsc/2311211101_YAGEO-RC0201FR-0753K6L_C474764.pdf; ComponentLink2Description: JLCPCB Part URL; ComponentLink2URL: https://jlcpcb.com/partdetail/C474764
pins: 1, 2
1 alternate drawing of the same symbol

## RC0201FR-0754K9L
designator R?  Resistance: 54.9kΩ  (hidden comment: *)
Resistor, 54.9kΩ, ±1%, 50mW, ±200ppm/℃, -55℃~+125℃, SMD 0201; Manufacturer: Uniroyal; Manufacturer Part Number: RC0201FR-0754K9L; Supplier 1: LCSC; Supplier Part Number 1: C474768; JLCPCB Part Number: C474768; Power Rating: 50mW; Category: Resistors; Package Size: 0201; JLCPCB Basic Part: Yes; Tolerance: ±1%; Temperature Coefficient: ±200ppm/℃; Temperature Rating: -55℃~+125℃; ComponentLink1Description: Datasheet; ComponentLink1URL: https://wmsc.lcsc.com/wmsc/upload/file/pdf/v2/lcsc/2311211101_YAGEO-RC0201FR-0754K9L_C474768.pdf; ComponentLink2Description: JLCPCB Part URL; ComponentLink2URL: https://jlcpcb.com/partdetail/C474768
pins: 1, 2
1 alternate drawing of the same symbol

## RC0201FR-0756K2L
designator R?  Resistance: 56.2kΩ  (hidden comment: *)
Resistor, 56.2kΩ, ±1%, 50mW, 25V, ±200ppm/℃, -55℃~+125℃, SMD 0201; Manufacturer: Uniroyal; Manufacturer Part Number: RC0201FR-0756K2L; Supplier 1: LCSC; Supplier Part Number 1: C327383; JLCPCB Part Number: C327383; Power Rating: 50mW; Category: Resistors; Package Size: 0201; JLCPCB Basic Part: Yes; Tolerance: ±1%; Voltage Rating: 25V; Temperature Coefficient: ±200ppm/℃; Temperature Rating: -55℃~+125℃; ComponentLink1Description: Datasheet; ComponentLink1URL: https://wmsc.lcsc.com/wmsc/upload/file/pdf/v2/lcsc/1811141154_YAGEO-RC0201FR-0756K2L_C327383.pdf; ComponentLink2Description: JLCPCB Part URL; ComponentLink2URL: https://jlcpcb.com/partdetail/C327383
pins: 1, 2
1 alternate drawing of the same symbol

## RC0201FR-0756KL
designator R?  Resistance: 56kΩ  (hidden comment: *)
Resistor, 56kΩ, ±1%, 50mW, ±200ppm/℃, -55℃~+125℃, SMD 0201; Manufacturer: Uniroyal; Manufacturer Part Number: RC0201FR-0756KL; Supplier 1: LCSC; Supplier Part Number 1: C474417; JLCPCB Part Number: C474417; Power Rating: 50mW; Category: Resistors; Package Size: 0201; JLCPCB Basic Part: Yes; Tolerance: ±1%; Temperature Coefficient: ±200ppm/℃; Temperature Rating: -55℃~+125℃; ComponentLink1Description: Datasheet; ComponentLink1URL: https://wmsc.lcsc.com/wmsc/upload/file/pdf/v2/lcsc/2311211101_YAGEO-RC0201FR-0756KL_C474417.pdf; ComponentLink2Description: JLCPCB Part URL; ComponentLink2URL: https://jlcpcb.com/partdetail/C474417
pins: 1, 2
1 alternate drawing of the same symbol

## RC0201FR-0756RL
designator R?  Resistance: 56Ω  (hidden comment: *)
Resistor, 56Ω, ±1%, 50mW, 25V, ±200ppm/℃, -55℃~+125℃, SMD 0201; Manufacturer: Uniroyal; Manufacturer Part Number: RC0201FR-0756RL; Supplier 1: LCSC; Supplier Part Number 1: C295809; JLCPCB Part Number: C295809; Power Rating: 50mW; Category: Resistors; Package Size: 0201; JLCPCB Basic Part: Yes; Tolerance: ±1%; Voltage Rating: 25V; Temperature Coefficient: ±200ppm/℃; Temperature Rating: -55℃~+125℃; ComponentLink1Description: Datasheet; ComponentLink1URL: https://wmsc.lcsc.com/wmsc/upload/file/pdf/v2/lcsc/2304140030_YAGEO-RC0201FR-0756RL_C295809.pdf; ComponentLink2Description: JLCPCB Part URL; ComponentLink2URL: https://jlcpcb.com/partdetail/C295809
pins: 1, 2
1 alternate drawing of the same symbol

## RC0201FR-0759KL
designator R?  Resistance: 59kΩ  (hidden comment: *)
Resistor, 59kΩ, ±1%, 50mW, 25V, ±200ppm/℃, -55℃~+125℃, SMD 0201; Manufacturer: Uniroyal; Manufacturer Part Number: RC0201FR-0759KL; Supplier 1: LCSC; Supplier Part Number 1: C138133; JLCPCB Part Number: C138133; Power Rating: 50mW; Category: Resistors; Package Size: 0201; JLCPCB Basic Part: Yes; Tolerance: ±1%; Voltage Rating: 25V; Temperature Coefficient: ±200ppm/℃; Temperature Rating: -55℃~+125℃; ComponentLink1Description: Datasheet; ComponentLink1URL: https://wmsc.lcsc.com/wmsc/upload/file/pdf/v2/lcsc/2304140030_YAGEO-RC0201FR-0759KL_C138133.pdf; ComponentLink2Description: JLCPCB Part URL; ComponentLink2URL: https://jlcpcb.com/partdetail/C138133
pins: 1, 2
1 alternate drawing of the same symbol

## RC0201FR-0759RL
designator R?  Resistance: 59Ω  (hidden comment: *)
Resistor, 59Ω, ±1%, 50mW, ±200ppm/℃, -55℃~+125℃, SMD 0201; Manufacturer: Uniroyal; Manufacturer Part Number: RC0201FR-0759RL; Supplier 1: LCSC; Supplier Part Number 1: C474778; JLCPCB Part Number: C474778; Power Rating: 50mW; Category: Resistors; Package Size: 0201; JLCPCB Basic Part: Yes; Tolerance: ±1%; Temperature Coefficient: ±200ppm/℃; Temperature Rating: -55℃~+125℃; ComponentLink1Description: Datasheet; ComponentLink1URL: https://wmsc.lcsc.com/wmsc/upload/file/pdf/v2/lcsc/2311211101_YAGEO-RC0201FR-0759RL_C474778.pdf; ComponentLink2Description: JLCPCB Part URL; ComponentLink2URL: https://jlcpcb.com/partdetail/C474778
pins: 1, 2
1 alternate drawing of the same symbol

## RC0201FR-0760K4L
designator R?  Resistance: 60.4kΩ  (hidden comment: *)
Resistor, 60.4kΩ, ±1%, 50mW, ±200ppm/℃, -55℃~+125℃, SMD 0201; Manufacturer: Uniroyal; Manufacturer Part Number: RC0201FR-0760K4L; Supplier 1: LCSC; Supplier Part Number 1: C77617; JLCPCB Part Number: C77617; Power Rating: 50mW; Category: Resistors; Package Size: 0201; JLCPCB Basic Part: Yes; Tolerance: ±1%; Temperature Coefficient: ±200ppm/℃; Temperature Rating: -55℃~+125℃; ComponentLink1Description: Datasheet; ComponentLink1URL: https://wmsc.lcsc.com/wmsc/upload/file/pdf/v2/lcsc/2008031207_YAGEO-RC0201FR-0760K4L_C77617.pdf; ComponentLink2Description: JLCPCB Part URL; ComponentLink2URL: https://jlcpcb.com/partdetail/C77617
pins: 1, 2
1 alternate drawing of the same symbol

## RC0201FR-0760R4L
designator R?  Resistance: 60.4Ω  (hidden comment: *)
Resistor, 60.4Ω, ±1%, 50mW, 25V, ±200ppm/℃, -55℃~+125℃, SMD 0201; Manufacturer: Uniroyal; Manufacturer Part Number: RC0201FR-0760R4L; Supplier 1: LCSC; Supplier Part Number 1: C138131; JLCPCB Part Number: C138131; Power Rating: 50mW; Category: Resistors; Package Size: 0201; JLCPCB Basic Part: Yes; Tolerance: ±1%; Voltage Rating: 25V; Temperature Coefficient: ±200ppm/℃; Temperature Rating: -55℃~+125℃; ComponentLink1Description: Datasheet; ComponentLink1URL: https://wmsc.lcsc.com/wmsc/upload/file/pdf/v2/lcsc/2304140030_YAGEO-RC0201FR-0760R4L_C138131.pdf; ComponentLink2Description: JLCPCB Part URL; ComponentLink2URL: https://jlcpcb.com/partdetail/C138131
pins: 1, 2
1 alternate drawing of the same symbol

## RC0201FR-0761K9L
designator R?  Resistance: 61.9kΩ  (hidden comment: *)
Resistor, 61.9kΩ, ±1%, 50mW, 25V, ±200ppm/℃, -55℃~+125℃, SMD 0201; Manufacturer: Uniroyal; Manufacturer Part Number: RC0201FR-0761K9L; Supplier 1: LCSC; Supplier Part Number 1: C474796; JLCPCB Part Number: C474796; Power Rating: 50mW; Category: Resistors; Package Size: 0201; JLCPCB Basic Part: Yes; Tolerance: ±1%; Voltage Rating: 25V; Temperature Coefficient: ±200ppm/℃; Temperature Rating: -55℃~+125℃; ComponentLink1Description: Datasheet; ComponentLink1URL: https://wmsc.lcsc.com/wmsc/upload/file/pdf/v2/lcsc/2311211101_YAGEO-RC0201FR-0761K9L_C474796.pdf; ComponentLink2Description: JLCPCB Part URL; ComponentLink2URL: https://jlcpcb.com/partdetail/C474796
pins: 1, 2
1 alternate drawing of the same symbol

## RC0201FR-0762KL
designator R?  Resistance: 62kΩ  (hidden comment: *)
Resistor, 62kΩ, ±1%, 50mW, 25V, ±200ppm/℃, -55℃~+125℃, SMD 0201; Manufacturer: Uniroyal; Manufacturer Part Number: RC0201FR-0762KL; Supplier 1: LCSC; Supplier Part Number 1: C295812; JLCPCB Part Number: C295812; Power Rating: 50mW; Category: Resistors; Package Size: 0201; JLCPCB Basic Part: Yes; Tolerance: ±1%; Voltage Rating: 25V; Temperature Coefficient: ±200ppm/℃; Temperature Rating: -55℃~+125℃; ComponentLink1Description: Datasheet; ComponentLink1URL: https://wmsc.lcsc.com/wmsc/upload/file/pdf/v2/lcsc/2304140030_YAGEO-RC0201FR-0762KL_C295812.pdf; ComponentLink2Description: JLCPCB Part URL; ComponentLink2URL: https://jlcpcb.com/partdetail/C295812
pins: 1, 2
1 alternate drawing of the same symbol

## RC0201FR-0763K4L
designator R?  Resistance: 63.4kΩ  (hidden comment: *)
Resistor, 63.4kΩ, ±1%, 50mW, 25V, ±200ppm/℃, -55℃~+125℃, SMD 0201; Manufacturer: Uniroyal; Manufacturer Part Number: RC0201FR-0763K4L; Supplier 1: LCSC; Supplier Part Number 1: C138130; JLCPCB Part Number: C138130; Power Rating: 50mW; Category: Resistors; Package Size: 0201; JLCPCB Basic Part: Yes; Tolerance: ±1%; Voltage Rating: 25V; Temperature Coefficient: ±200ppm/℃; Temperature Rating: -55℃~+125℃; ComponentLink1Description: Datasheet; ComponentLink1URL: https://wmsc.lcsc.com/wmsc/upload/file/pdf/v2/lcsc/2304140030_YAGEO-RC0201FR-0763K4L_C138130.pdf; ComponentLink2Description: JLCPCB Part URL; ComponentLink2URL: https://jlcpcb.com/partdetail/C138130
pins: 1, 2
1 alternate drawing of the same symbol

## RC0201FR-0764K9L
designator R?  Resistance: 64.9kΩ  (hidden comment: *)
Resistor, 64.9kΩ, ±1%, 50mW, ±200ppm/℃, -55℃~+125℃, SMD 0201; Manufacturer: Uniroyal; Manufacturer Part Number: RC0201FR-0764K9L; Supplier 1: LCSC; Supplier Part Number 1: C474803; JLCPCB Part Number: C474803; Power Rating: 50mW; Category: Resistors; Package Size: 0201; JLCPCB Basic Part: Yes; Tolerance: ±1%; Temperature Coefficient: ±200ppm/℃; Temperature Rating: -55℃~+125℃; ComponentLink1Description: Datasheet; ComponentLink1URL: https://wmsc.lcsc.com/wmsc/upload/file/pdf/v2/lcsc/2311211101_YAGEO-RC0201FR-0764K9L_C474803.pdf; ComponentLink2Description: JLCPCB Part URL; ComponentLink2URL: https://jlcpcb.com/partdetail/C474803
pins: 1, 2
1 alternate drawing of the same symbol